# Altium integrated library Jack_LibraryLibPkg.IntLib: 77 symbols (continued)
## 100nF Cap (continued)
footprint 0402 Capacitor (Chip Capacitor, 2-Leads, Body 1.00x0.50mm, IPC Medium Density)
pins: 1, 2

## 220pF_Cap
designator C?  value 220pF  (hidden comment: 220pF_Cap)
50V 220pF X7R ±10% 0603 Multilayer Ceramic Capacitors MLCC - SMD/SMT ROHS; Manufacturer: Samsung Electro-Mechanics; Manufacturer Part Number: CL10B221KB8NNNC; Supplier: LCSC; Supplier Part Number: C1603; ComponentLink1URL: https://datasheet.octopart.com:443/CL10B221KB8NNNC-Samsung-Electro-Mechanics-datasheet-136482329.pdf?src-supplier=IHS; ComponentLink1Description: https://datasheet.octopart.com:443/CL10B221KB8NNNC-Samsung-Electro-Mechanics-datasheet-136482329.pdf?src-supplier=IHS; ComponentLink2URL: https://datasheet.octopart.com/CL10B221KB8NNNC-Samsung-Electro-Mechanics-datasheet-8324245.pdf; ComponentLink2Description: https://datasheet.octopart.com/CL10B221KB8NNNC-Samsung-Electro-Mechanics-datasheet-8324245.pdf; ComponentLink3URL: https://datasheet.octopart.com/CL10B221KB8NNNC-Samsung-Electro-Mechanics-datasheet-97040617.pdf; ComponentLink3Description: https://datasheet.octopart.com/CL10B221KB8NNNC-Samsung-Electro-Mechanics-datasheet-97040617.pdf; ComponentLink4URL: https://datasheet.octopart.com/General-Multilayer-Ceramic-Capacitors-Samsung-datasheet-family-111.pdf; ComponentLink4Description: https://datasheet.octopart.com/General-Multilayer-Ceramic-Capacitors-Samsung-datasheet-family-111.pdf; ComponentLink5URL: https://datasheet.octopart.com:443/CL10B221KB8NNNC-Samsung-Electro-Mechanics-datasheet-116120877.pdf?src-supplier=Future+Electronics; ComponentLink5Description: https://datasheet.octopart.com:443/CL10B221KB8NNNC-Samsung-Electro-Mechanics-datasheet-116120877.pdf?src-supplier=Future+Electronics; ComponentLink6URL: https://datasheet.octopart.com:443/CL10B221KB8NNNC-Samsung-Electro-Mechanics-datasheet-81461868.pdf?src-supplier=Future+Electronics; ComponentLink6Description: https://datasheet.octopart.com:443/CL10B221KB8NNNC-Samsung-Electro-Mechanics-datasheet-81461868.pdf?src-supplier=Future+Electronics; ComponentLink7URL: https://datasheet.octopart.com:443/CL10B221KB8NNNC-Samsung-datasheet-26669033.pdf?src-supplier=Future+Electronics; ComponentLink7Description: https://datasheet.octopart.com:443/CL10B221KB8NNNC-Samsung-datasheet-26669033.pdf?src-supplier=Future+Electronics; ComponentLink8URL: https://datasheet.octopart.com:443/CL10B221KB8NNNC-Samsung-Electro-Mechanics-datasheet-149136815.pdf?src-supplier=Future+Electronics; ComponentLink8Description: https://datasheet.octopart.com:443/CL10B221KB8NNNC-Samsung-Electro-Mechanics-datasheet-149136815.pdf?src-supplier=Future+Electronics; ComponentLink9URL: https://datasheet.octopart.com:443/CL10B221KB8NNNC-Samsung-datasheet-37081328.pdf?src-supplier=Future+Electronics; ComponentLink9Description: https://datasheet.octopart.com:443/CL10B221KB8NNNC-Samsung-datasheet-37081328.pdf?src-supplier=Future+Electronics; ComponentLink10URL: https://datasheet.octopart.com:443/CL10B221KB8NNNC-Samsung-datasheet-8326407.pdf?src-supplier=TME; ComponentLink10Description: https://datasheet.octopart.com:443/CL10B221KB8NNNC-Samsung-datasheet-8326407.pdf?src-supplier=TME; ComponentLink11URL: https://datasheet.octopart.com:443/CL10B221KB8NNNC-Samsung-Electro-Mechanics-datasheet-11541288.pdf?src-supplier=Arrow+Electronics; ComponentLink11Description: https://datasheet.octopart.com:443/CL10B221KB8NNNC-Samsung-Electro-Mechanics-datasheet-11541288.pdf?src-supplier=Arrow+Electronics; ComponentLink12URL: http://sigma.octopart.com:80/rohs_certificate/General-Multilayer-Ceramic-Capacitors-Samsung-family-110.pdf?src-supplier=Compliance+Statements; ComponentLink12Description: http://sigma.octopart.com:80/rohs_certificate/General-Multilayer-Ceramic-Capacitors-Samsung-family-110.pdf?src-supplier=Compliance+Statements; ComponentLink13URL: http://sigma.octopart.com:80/rohs_statement/General-Multilayer-Ceramic-Capacitors-Samsung-family-132.pdf?src-supplier=Compliance+Statements; ComponentLink13Description: http://sigma.octopart.com:80/rohs_statement/General-Multilayer-Ceramic-Capacitors-Samsung-family-132.pdf?src-supplier=Compliance+Statements; ComponentLink14URL: http://sigma.octopart.com:80/reach_statement/General-Multilayer-Ceramic-Capacitors-Samsung-family-133.pdf?src-supplier=Compliance+Statements; ComponentLink14Description: http://sigma.octopart.com:80/reach_statement/General-Multilayer-Ceramic-Capacitors-Samsung-family-133.pdf?src-supplier=Compliance+Statements
footprint 0603 Capacitor (Chip Capacitor, 2-Leads, Body 1.60x0.80mm, IPC Medium Density)
pins: 1, 2

## 499kRes
designator R?  value 499k  (hidden comment: 499kRes)
Resistor; Manufacturer: UNI-ROYAL(Uniroyal Elec); Manufacturer Part Number: 0603WAF4993T5E; Supplier: LCSC; Supplier Part Number: C26751
footprint 0603 Resistor (Chip Resistor, 2-Leads, Body 1.60x0.80mm, IPC Medium Density)
pins: 1, 2

## 2870_Res
designator R?  value 2870  (hidden comment: 2870_Res)
Resistor; Manufacturer: UNI-ROYAL(Uniroyal Elec); Manufacturer Part Number: 0603WAF2871T5E; Supplier: LCSC; Supplier Part Number: C22907
footprint 0603 Resistor (Chip Resistor, 2-Leads, Body 1.60x0.80mm, IPC Medium Density)
pins: 1, 2

## 12401826E412A
designator J?
USB Connector, 24 Contact(s), Female, Right Angle, Surface Mount Terminal, Locking, Receptacle; Manufacturer: Amphenol; Supplier: LCSC; Supplier Part Number: C3197788; Manufacturer Part Number: 12401826E412A; ComponentLink1URL: https://datasheet.octopart.com:443/12401826E412A-Amphenol-Communications-Solutions-datasheet-182242332.pdf?src-supplier=IHS; ComponentLink1Description: https://datasheet.octopart.com:443/12401826E412A-Amphenol-Communications-Solutions-datasheet-182242332.pdf?src-supplier=IHS; ComponentLink2URL: https://datasheet.octopart.com:443/12401826E412A-Amphenol-datasheet-112029729.pdf?src-supplier=Master+Electronics; ComponentLink2Description: https://datasheet.octopart.com:443/12401826E412A-Amphenol-datasheet-112029729.pdf?src-supplier=Master+Electronics
footprint 12401826E412A USBC
pins: A1 GND, A2 TX1+, A3 TX1-, A4 VBUS, A5 CC1, A6 D+, A7 D-, A8 SBU1, A9 VBUS, A10 RX2-, A11 RX2+, A12 GND, B1 GND, B2 TX2+, B3 TX2-, B4 VBUS, B5 CC2, B6 D+, B7 D-, B8 SBU2, B9 VBUS, B10 RX1-, B11 RX1+, B12 GND, SH1 SHEILD, SH2 SHEILD, SH3 SHEILD, SH4 SHEILD

## 527450897_CAN
designator J?
FFC / FPC Board Connector, 0.5 mm, 8 Contacts, Receptacle, Easy-On 52745 Series, Surface Mount; Manufacturer: Molex; Manufacturer Part Number: 52745-0897; Supplier: LCSC; Supplier Part Number: C277391; ComponentLink1URL: https://datasheet.octopart.com:443/52745-0897-Molex-datasheet-180776580.pdf?src-supplier=IHS; ComponentLink1Description: https://datasheet.octopart.com:443/52745-0897-Molex-datasheet-180776580.pdf?src-supplier=IHS; ComponentLink2URL: https://datasheet.octopart.com:443/52745-0897-Molex-datasheet-13777365.pdf?src-supplier=Sager+Electronics; ComponentLink2Description: https://datasheet.octopart.com:443/52745-0897-Molex-datasheet-13777365.pdf?src-supplier=Sager+Electronics; ComponentLink3URL: https://datasheet.octopart.com:443/0527450897-Molex-datasheet-155331244.pdf?src-supplier=Sager+Electronics; ComponentLink3Description: https://datasheet.octopart.com:443/0527450897-Molex-datasheet-155331244.pdf?src-supplier=Sager+Electronics; ComponentLink4URL: https://sigma.octopart.com:443/15649097/technical_drawing/Molex-52745-0897.pdf?src-supplier=Molex; ComponentLink4Description: https://sigma.octopart.com:443/15649097/technical_drawing/Molex-52745-0897.pdf?src-supplier=Molex; ComponentLink5URL: https://datasheet.octopart.com:443/527450897-Molex-datasheet-8335871.pdf?src-supplier=Molex; ComponentLink5Description: https://datasheet.octopart.com:443/527450897-Molex-datasheet-8335871.pdf?src-supplier=Molex; ComponentLink6URL: https://datasheet.octopart.com:443/52745-0897-Molex-datasheet-66420196.pdf?src-supplier=Farnell; ComponentLink6Description: https://datasheet.octopart.com:443/52745-0897-Molex-datasheet-66420196.pdf?src-supplier=Farnell; ComponentLink7URL: https://datasheet.octopart.com:443/52745-0897-Molex-datasheet-17587070.pdf?src-supplier=Farnell; ComponentLink7Description: https://datasheet.octopart.com:443/52745-0897-Molex-datasheet-17587070.pdf?src-supplier=Farnell; ComponentLink8URL: https://datasheet.octopart.com:443/52745-0897-Molex-datasheet-66628626.pdf?src-supplier=element14+APAC; ComponentLink8Description: https://datasheet.octopart.com:443/52745-0897-Molex-datasheet-66628626.pdf?src-supplier=element14+APAC; ComponentLink9URL: https://datasheet.octopart.com:443/52745-0897.-Molex-datasheet-68625854.pdf?src-supplier=element14+APAC; ComponentLink9Description: https://datasheet.octopart.com:443/52745-0897.-Molex-datasheet-68625854.pdf?src-supplier=element14+APAC; ComponentLink10URL: https://datasheet.octopart.com:443/52745-0897-Molex-datasheet-48881491.pdf?src-supplier=element14+APAC; ComponentLink10Description: https://datasheet.octopart.com:443/52745-0897-Molex-datasheet-48881491.pdf?src-supplier=element14+APAC; ComponentLink11URL: https://datasheet.octopart.com:443/52745-0897-Molex-datasheet-154755773.pdf?src-supplier=Master+Electronics; ComponentLink11Description: https://datasheet.octopart.com:443/52745-0897-Molex-datasheet-154755773.pdf?src-supplier=Master+Electronics; ComponentLink12URL: https://datasheet.octopart.com:443/52745-0897-Molex-datasheet-140186379.pdf?src-supplier=RS+(Formerly+Allied+Electronics); ComponentLink12Description: https://datasheet.octopart.com:443/52745-0897-Molex-datasheet-140186379.pdf?src-supplier=RS+(Formerly+Allied+Electronics); ComponentLink13URL: https://datasheet.octopart.com:443/52745-0897-Molex-datasheet-120153560.pdf?src-supplier=RS+(Formerly+Allied+Electronics); ComponentLink13Description: https://datasheet.octopart.com:443/52745-0897-Molex-datasheet-120153560.pdf?src-supplier=RS+(Formerly+Allied+Electronics); ComponentLink14URL: https://datasheet.octopart.com:443/52745-0897-Molex-datasheet-28806792.pdf?src-supplier=RS+(Formerly+Allied+Electronics); ComponentLink14Description: https://datasheet.octopart.com:443/52745-0897-Molex-datasheet-28806792.pdf?src-supplier=RS+(Formerly+Allied+Electronics); ComponentLink15URL: https://datasheet.octopart.com:443/52745-0897-Molex-datasheet-21218790.pdf?src-supplier=TME; ComponentLink15Description: https://datasheet.octopart.com:443/52745-0897-Molex-datasheet-21218790.pdf?src-supplier=TME; ComponentLink16URL: https://datasheet.octopart.com:443/0527450897-Molex-datasheet-11838050.pdf?src-supplier=Arrow+Electronics; ComponentLink16Description: https://datasheet.octopart.com:443/0527450897-Molex-datasheet-11838050.pdf?src-supplier=Arrow+Electronics; ComponentLink17URL: https://datasheet.octopart.com:443/0527450897-Molex-datasheet-11618016.pdf?src-supplier=Arrow+Electronics; ComponentLink17Description: https://datasheet.octopart.com:443/0527450897-Molex-datasheet-11618016.pdf?src-supplier=Arrow+Electronics; ComponentLink18URL: http://sigma.octopart.com:80/15649100/rohs_statement/Molex-52745-0897.pdf?src-supplier=Compliance+Statements; ComponentLink18Description: http://sigma.octopart.com:80/15649100/rohs_statement/Molex-52745-0897.pdf?src-supplier=Compliance+Statements; ComponentLink19URL: http://sigma.octopart.com:80/reach_statement/Molex-company-74.pdf?src-supplier=Compliance+Statements; ComponentLink19Description: http://sigma.octopart.com:80/reach_statement/Molex-company-74.pdf?src-supplier=Compliance+Statements; ComponentLink20URL: http://sigma.octopart.com:80/rohs_statement/Molex-company-73.pdf?src-supplier=Compliance+Statements; ComponentLink20Description: http://sigma.octopart.com:80/rohs_statement/Molex-company-73.pdf?src-supplier=Compliance+Statements; ComponentLink21URL: http://sigma.octopart.com:80/conflict_mineral_statement/Molex-company-72.pdf?src-supplier=Compliance+Statements; ComponentLink21Description: http://sigma.octopart.com:80/conflict_mineral_statement/Molex-company-72.pdf?src-supplier=Compliance+Statements
footprint 527450897 FPC
pins: 1 SDA, 2 SCL, 3 GND, 4 CANH, 5 CANL, 6 GND, 7 VIN, 8 VIN, P1 MP1, P2 MP2

## 527450897_LCD
designator J?
FFC / FPC Board Connector, 0.5 mm, 8 Contacts, Receptacle, Easy-On 52745 Series, Surface Mount; Manufacturer: Molex; Manufacturer Part Number: 52745-0897; Supplier: LCSC; Supplier Part Number: C277391; ComponentLink1URL: https://datasheet.octopart.com:443/52745-0897-Molex-datasheet-180776580.pdf?src-supplier=IHS; ComponentLink1Description: https://datasheet.octopart.com:443/52745-0897-Molex-datasheet-180776580.pdf?src-supplier=IHS; ComponentLink2URL: https://datasheet.octopart.com:443/52745-0897-Molex-datasheet-13777365.pdf?src-supplier=Sager+Electronics; ComponentLink2Description: https://datasheet.octopart.com:443/52745-0897-Molex-datasheet-13777365.pdf?src-supplier=Sager+Electronics; ComponentLink3URL: https://datasheet.octopart.com:443/0527450897-Molex-datasheet-155331244.pdf?src-supplier=Sager+Electronics; ComponentLink3Description: https://datasheet.octopart.com:443/0527450897-Molex-datasheet-155331244.pdf?src-supplier=Sager+Electronics; ComponentLink4URL: https://sigma.octopart.com:443/15649097/technical_drawing/Molex-52745-0897.pdf?src-supplier=Molex; ComponentLink4Description: https://sigma.octopart.com:443/15649097/technical_drawing/Molex-52745-0897.pdf?src-supplier=Molex; ComponentLink5URL: https://datasheet.octopart.com:443/527450897-Molex-datasheet-8335871.pdf?src-supplier=Molex; ComponentLink5Description: https://datasheet.octopart.com:443/527450897-Molex-datasheet-8335871.pdf?src-supplier=Molex; ComponentLink6URL: https://datasheet.octopart.com:443/52745-0897-Molex-datasheet-66420196.pdf?src-supplier=Farnell; ComponentLink6Description: https://datasheet.octopart.com:443/52745-0897-Molex-datasheet-66420196.pdf?src-supplier=Farnell; ComponentLink7URL: https://datasheet.octopart.com:443/52745-0897-Molex-datasheet-17587070.pdf?src-supplier=Farnell; ComponentLink7Description: https://datasheet.octopart.com:443/52745-0897-Molex-datasheet-17587070.pdf?src-supplier=Farnell; ComponentLink8URL: https://datasheet.octopart.com:443/52745-0897-Molex-datasheet-66628626.pdf?src-supplier=element14+APAC; ComponentLink8Description: https://datasheet.octopart.com:443/52745-0897-Molex-datasheet-66628626.pdf?src-supplier=element14+APAC; ComponentLink9URL: https://datasheet.octopart.com:443/52745-0897.-Molex-datasheet-68625854.pdf?src-supplier=element14+APAC; ComponentLink9Description: https://datasheet.octopart.com:443/52745-0897.-Molex-datasheet-68625854.pdf?src-supplier=element14+APAC; ComponentLink10URL: https://datasheet.octopart.com:443/52745-0897-Molex-datasheet-48881491.pdf?src-supplier=element14+APAC; ComponentLink10Description: https://datasheet.octopart.com:443/52745-0897-Molex-datasheet-48881491.pdf?src-supplier=element14+APAC; ComponentLink11URL: https://datasheet.octopart.com:443/52745-0897-Molex-datasheet-154755773.pdf?src-supplier=Master+Electronics; ComponentLink11Description: https://datasheet.octopart.com:443/52745-0897-Molex-datasheet-154755773.pdf?src-supplier=Master+Electronics; ComponentLink12URL: https://datasheet.octopart.com:443/52745-0897-Molex-datasheet-140186379.pdf?src-supplier=RS+(Formerly+Allied+Electronics); ComponentLink12Description: https://datasheet.octopart.com:443/52745-0897-Molex-datasheet-140186379.pdf?src-supplier=RS+(Formerly+Allied+Electronics); ComponentLink13URL: https://datasheet.octopart.com:443/52745-0897-Molex-datasheet-120153560.pdf?src-supplier=RS+(Formerly+Allied+Electronics); ComponentLink13Description: https://datasheet.octopart.com:443/52745-0897-Molex-datasheet-120153560.pdf?src-supplier=RS+(Formerly+Allied+Electronics); ComponentLink14URL: https://datasheet.octopart.com:443/52745-0897-Molex-datasheet-28806792.pdf?src-supplier=RS+(Formerly+Allied+Electronics); ComponentLink14Description: https://datasheet.octopart.com:443/52745-0897-Molex-datasheet-28806792.pdf?src-supplier=RS+(Formerly+Allied+Electronics); ComponentLink15URL: https://datasheet.octopart.com:443/52745-0897-Molex-datasheet-21218790.pdf?src-supplier=TME; ComponentLink15Description: https://datasheet.octopart.com:443/52745-0897-Molex-datasheet-21218790.pdf?src-supplier=TME; ComponentLink16URL: https://datasheet.octopart.com:443/0527450897-Molex-datasheet-11838050.pdf?src-supplier=Arrow+Electronics; ComponentLink16Description: https://datasheet.octopart.com:443/0527450897-Molex-datasheet-11838050.pdf?src-supplier=Arrow+Electronics; ComponentLink17URL: https://datasheet.octopart.com:443/0527450897-Molex-datasheet-11618016.pdf?src-supplier=Arrow+Electronics; ComponentLink17Description: https://datasheet.octopart.com:443/0527450897-Molex-datasheet-11618016.pdf?src-supplier=Arrow+Electronics; ComponentLink18URL: http://sigma.octopart.com:80/15649100/rohs_statement/Molex-52745-0897.pdf?src-supplier=Compliance+Statements; ComponentLink18Description: http://sigma.octopart.com:80/15649100/rohs_statement/Molex-52745-0897.pdf?src-supplier=Compliance+Statements; ComponentLink19URL: http://sigma.octopart.com:80/reach_statement/Molex-company-74.pdf?src-supplier=Compliance+Statements; ComponentLink19Description: http://sigma.octopart.com:80/reach_statement/Molex-company-74.pdf?src-supplier=Compliance+Statements; ComponentLink20URL: http://sigma.octopart.com:80/rohs_statement/Molex-company-73.pdf?src-supplier=Compliance+Statements; ComponentLink20Description: http://sigma.octopart.com:80/rohs_statement/Molex-company-73.pdf?src-supplier=Compliance+Statements; ComponentLink21URL: http://sigma.octopart.com:80/conflict_mineral_statement/Molex-company-72.pdf?src-supplier=Compliance+Statements; ComponentLink21Description: http://sigma.octopart.com:80/conflict_mineral_statement/Molex-company-72.pdf?src-supplier=Compliance+Statements
footprint 527450897 FPC
pins: 1 GND, 2 NC, 3 VDD, 4 SCL, 5 SDA, 6 INT, 7 RESET, 8 GND, P1 MP1, P2 MP2

## 527452097
designator J?
FFC / FPC Connectors FFC, FPC Contacts, Top Surface Mount, Right Angle T/R; Manufacturer: Molex; Manufacturer Part Number: 52745-2097; Supplier: LCSC; Supplier Part Number: C164167; ComponentLink1URL: https://datasheet.octopart.com:443/52745-2097-Molex-datasheet-180776580.pdf?src-supplier=IHS; ComponentLink1Description: https://datasheet.octopart.com:443/52745-2097-Molex-datasheet-180776580.pdf?src-supplier=IHS; ComponentLink2URL: https://datasheet.octopart.com:443/52745-2097-Molex-datasheet-13775033.pdf?src-supplier=Molex; ComponentLink2Description: https://datasheet.octopart.com:443/52745-2097-Molex-datasheet-13775033.pdf?src-supplier=Molex; ComponentLink3URL: https://sigma.octopart.com:443/15649097/technical_drawing/Molex-52745-2097.pdf?src-supplier=Molex; ComponentLink3Description: https://sigma.octopart.com:443/15649097/technical_drawing/Molex-52745-2097.pdf?src-supplier=Molex; ComponentLink4URL: https://datasheet.octopart.com:443/527452097-Molex-datasheet-8335871.pdf?src-supplier=Factory+Futures; ComponentLink4Description: https://datasheet.octopart.com:443/527452097-Molex-datasheet-8335871.pdf?src-supplier=Factory+Futures; ComponentLink5URL: https://datasheet.octopart.com:443/52745-2097-Molex-datasheet-11535467.pdf?src-supplier=Arrow+Electronics; ComponentLink5Description: https://datasheet.octopart.com:443/52745-2097-Molex-datasheet-11535467.pdf?src-supplier=Arrow+Electronics; ComponentLink6URL: https://datasheet.octopart.com:443/0527452097-Molex-datasheet-11973683.pdf?src-supplier=Arrow+Electronics; ComponentLink6Description: https://datasheet.octopart.com:443/0527452097-Molex-datasheet-11973683.pdf?src-supplier=Arrow+Electronics; ComponentLink7URL: https://datasheet.octopart.com:443/52745-2097-Molex-datasheet-154755790.pdf?src-supplier=Master+Electronics; ComponentLink7Description: https://datasheet.octopart.com:443/52745-2097-Molex-datasheet-154755790.pdf?src-supplier=Master+Electronics; ComponentLink8URL: https://datasheet.octopart.com:443/52745-2097-Molex-datasheet-66628635.pdf?src-supplier=element14+APAC; ComponentLink8Description: https://datasheet.octopart.com:443/52745-2097-Molex-datasheet-66628635.pdf?src-supplier=element14+APAC; ComponentLink9URL: https://datasheet.octopart.com:443/52745-2097-Molex-datasheet-140186386.pdf?src-supplier=RS+(Formerly+Allied+Electronics); ComponentLink9Description: https://datasheet.octopart.com:443/52745-2097-Molex-datasheet-140186386.pdf?src-supplier=RS+(Formerly+Allied+Electronics); ComponentLink10URL: https://datasheet.octopart.com:443/52745-2097-Molex-datasheet-120153567.pdf?src-supplier=RS+(Formerly+Allied+Electronics); ComponentLink10Description: https://datasheet.octopart.com:443/52745-2097-Molex-datasheet-120153567.pdf?src-supplier=RS+(Formerly+Allied+Electronics); ComponentLink11URL: https://datasheet.octopart.com:443/52745-2097-Molex-datasheet-62059355.pdf?src-supplier=RS+(Formerly+Allied+Electronics); ComponentLink11Description: https://datasheet.octopart.com:443/52745-2097-Molex-datasheet-62059355.pdf?src-supplier=RS+(Formerly+Allied+Electronics); ComponentLink12URL: https://datasheet.octopart.com:443/52745-2097-Molex-datasheet-77521212.pdf?src-supplier=Newark; ComponentLink12Description: https://datasheet.octopart.com:443/52745-2097-Molex-datasheet-77521212.pdf?src-supplier=Newark; ComponentLink13URL: https://datasheet.octopart.com:443/52745-2097-Molex-datasheet-62116793.pdf?src-supplier=Electro+Sonic; ComponentLink13Description: https://datasheet.octopart.com:443/52745-2097-Molex-datasheet-62116793.pdf?src-supplier=Electro+Sonic; ComponentLink14URL: https://datasheet.octopart.com:443/52745-2097-Molex-datasheet-28806792.pdf?src-supplier=TME; ComponentLink14Description: https://datasheet.octopart.com:443/52745-2097-Molex-datasheet-28806792.pdf?src-supplier=TME; ComponentLink15URL: https://datasheet.octopart.com:443/52745-2097-Molex-datasheet-10979466.pdf?src-supplier=Farnell; ComponentLink15Description: https://datasheet.octopart.com:443/52745-2097-Molex-datasheet-10979466.pdf?src-supplier=Farnell; ComponentLink16URL: https://datasheet.octopart.com:443/52745-2097-Molex-datasheet-8878058.pdf?src-supplier=Farnell; ComponentLink16Description: https://datasheet.octopart.com:443/52745-2097-Molex-datasheet-8878058.pdf?src-supplier=Farnell; ComponentLink17URL: http://sigma.octopart.com:80/15649113/rohs_statement/Molex-52745-2097.pdf?src-supplier=Compliance+Statements; ComponentLink17Description: http://sigma.octopart.com:80/15649113/rohs_statement/Molex-52745-2097.pdf?src-supplier=Compliance+Statements; ComponentLink18URL: http://sigma.octopart.com:80/reach_statement/Molex-company-74.pdf?src-supplier=Compliance+Statements; ComponentLink18Description: http://sigma.octopart.com:80/reach_statement/Molex-company-74.pdf?src-supplier=Compliance+Statements; ComponentLink19URL: http://sigma.octopart.com:80/rohs_statement/Molex-company-73.pdf?src-supplier=Compliance+Statements; ComponentLink19Description: http://sigma.octopart.com:80/rohs_statement/Molex-company-73.pdf?src-supplier=Compliance+Statements; ComponentLink20URL: http://sigma.octopart.com:80/conflict_mineral_statement/Molex-company-72.pdf?src-supplier=Compliance+Statements; ComponentLink20Description: http://sigma.octopart.com:80/conflict_mineral_statement/Molex-company-72.pdf?src-supplier=Compliance+Statements
footprint 527452097 20 pin FPC
pins: 1 NC, 2 LEDK, 3 NC, 4 LEDA, 5 NC, 6 VCI, 7 VCC_IO, 8 TE, 9 RESET, 10 GND, 11 MIPI_D1P, 12 MIPI_D1N, 13 GND, 14 MIPI_CLP, 15 MIPI_CLN, 16 GND, 17 MIPI_D0P, 18 MIPI_D0N, 19 GND, 20 GND, P1 MP1, P2 MP2

## 527452097_LED
designator J?
FFC / FPC Connectors FFC, FPC Contacts, Top Surface Mount, Right Angle T/R / Pinout for LED control.; Manufacturer: Molex; Manufacturer Part Number: 52745-2097; Supplier: LCSC; Supplier Part Number: C164167; ComponentLink1URL: https://datasheet.octopart.com:443/52745-2097-Molex-datasheet-180776580.pdf?src-supplier=IHS; ComponentLink1Description: https://datasheet.octopart.com:443/52745-2097-Molex-datasheet-180776580.pdf?src-supplier=IHS; ComponentLink2URL: https://datasheet.octopart.com:443/52745-2097-Molex-datasheet-13775033.pdf?src-supplier=Molex; ComponentLink2Description: https://datasheet.octopart.com:443/52745-2097-Molex-datasheet-13775033.pdf?src-supplier=Molex; ComponentLink3URL: https://sigma.octopart.com:443/15649097/technical_drawing/Molex-52745-2097.pdf?src-supplier=Molex; ComponentLink3Description: https://sigma.octopart.com:443/15649097/technical_drawing/Molex-52745-2097.pdf?src-supplier=Molex; ComponentLink4URL: https://datasheet.octopart.com:443/527452097-Molex-datasheet-8335871.pdf?src-supplier=Factory+Futures; ComponentLink4Description: https://datasheet.octopart.com:443/527452097-Molex-datasheet-8335871.pdf?src-supplier=Factory+Futures; ComponentLink5URL: https://datasheet.octopart.com:443/52745-2097-Molex-datasheet-11535467.pdf?src-supplier=Arrow+Electronics; ComponentLink5Description: https://datasheet.octopart.com:443/52745-2097-Molex-datasheet-11535467.pdf?src-supplier=Arrow+Electronics; ComponentLink6URL: https://datasheet.octopart.com:443/0527452097-Molex-datasheet-11973683.pdf?src-supplier=Arrow+Electronics; ComponentLink6Description: https://datasheet.octopart.com:443/0527452097-Molex-datasheet-11973683.pdf?src-supplier=Arrow+Electronics; ComponentLink7URL: https://datasheet.octopart.com:443/52745-2097-Molex-datasheet-154755790.pdf?src-supplier=Master+Electronics; ComponentLink7Description: https://datasheet.octopart.com:443/52745-2097-Molex-datasheet-154755790.pdf?src-supplier=Master+Electronics; ComponentLink8URL: https://datasheet.octopart.com:443/52745-2097-Molex-datasheet-66628635.pdf?src-supplier=element14+APAC; ComponentLink8Description: https://datasheet.octopart.com:443/52745-2097-Molex-datasheet-66628635.pdf?src-supplier=element14+APAC; ComponentLink9URL: https://datasheet.octopart.com:443/52745-2097-Molex-datasheet-140186386.pdf?src-supplier=RS+(Formerly+Allied+Electronics); ComponentLink9Description: https://datasheet.octopart.com:443/52745-2097-Molex-datasheet-140186386.pdf?src-supplier=RS+(Formerly+Allied+Electronics); ComponentLink10URL: https://datasheet.octopart.com:443/52745-2097-Molex-datasheet-120153567.pdf?src-supplier=RS+(Formerly+Allied+Electronics); ComponentLink10Description: https://datasheet.octopart.com:443/52745-2097-Molex-datasheet-120153567.pdf?src-supplier=RS+(Formerly+Allied+Electronics); ComponentLink11URL: https://datasheet.octopart.com:443/52745-2097-Molex-datasheet-62059355.pdf?src-supplier=RS+(Formerly+Allied+Electronics); ComponentLink11Description: https://datasheet.octopart.com:443/52745-2097-Molex-datasheet-62059355.pdf?src-supplier=RS+(Formerly+Allied+Electronics); ComponentLink12URL: https://datasheet.octopart.com:443/52745-2097-Molex-datasheet-77521212.pdf?src-supplier=Newark; ComponentLink12Description: https://datasheet.octopart.com:443/52745-2097-Molex-datasheet-77521212.pdf?src-supplier=Newark; ComponentLink13URL: https://datasheet.octopart.com:443/52745-2097-Molex-datasheet-62116793.pdf?src-supplier=Electro+Sonic; ComponentLink13Description: https://datasheet.octopart.com:443/52745-2097-Molex-datasheet-62116793.pdf?src-supplier=Electro+Sonic; ComponentLink14URL: https://datasheet.octopart.com:443/52745-2097-Molex-datasheet-28806792.pdf?src-supplier=TME; ComponentLink14Description: https://datasheet.octopart.com:443/52745-2097-Molex-datasheet-28806792.pdf?src-supplier=TME; ComponentLink15URL: https://datasheet.octopart.com:443/52745-2097-Molex-datasheet-10979466.pdf?src-supplier=Farnell; ComponentLink15Description: https://datasheet.octopart.com:443/52745-2097-Molex-datasheet-10979466.pdf?src-supplier=Farnell; ComponentLink16URL: https://datasheet.octopart.com:443/52745-2097-Molex-datasheet-8878058.pdf?src-supplier=Farnell; ComponentLink16Description: https://datasheet.octopart.com:443/52745-2097-Molex-datasheet-8878058.pdf?src-supplier=Farnell; ComponentLink17URL: http://sigma.octopart.com:80/15649113/rohs_statement/Molex-52745-2097.pdf?src-supplier=Compliance+Statements; ComponentLink17Description: http://sigma.octopart.com:80/15649113/rohs_statement/Molex-52745-2097.pdf?src-supplier=Compliance+Statements; ComponentLink18URL: http://sigma.octopart.com:80/reach_statement/Molex-company-74.pdf?src-supplier=Compliance+Statements; ComponentLink18Description: http://sigma.octopart.com:80/reach_statement/Molex-company-74.pdf?src-supplier=Compliance+Statements; ComponentLink19URL: http://sigma.octopart.com:80/rohs_statement/Molex-company-73.pdf?src-supplier=Compliance+Statements; ComponentLink19Description: http://sigma.octopart.com:80/rohs_statement/Molex-company-73.pdf?src-supplier=Compliance+Statements; ComponentLink20URL: http://sigma.octopart.com:80/conflict_mineral_statement/Molex-company-72.pdf?src-supplier=Compliance+Statements; ComponentLink20Description: http://sigma.octopart.com:80/conflict_mineral_statement/Molex-company-72.pdf?src-supplier=Compliance+Statements
footprint 527452097 20 pin FPC
pins: 1 LED1A, 2 LED8K, 3 LED2A, 4 LED7K, 5 LED3A, 6 LED6K, 7 LED4A, 8 LED5K, 9 LED5A, 10 LED4K, 11 LED6A, 12 LED3K, 13 LED7A, 14 LED2K, 15 LED8A, 16 LED1K, 17 GND, 18 SCL, 19 SDA, 20 VCC, P1 MP1, P2 MP2

## 527452097_LED_B_Side
designator J?, comment 527452097_LED
FFC / FPC Connectors FFC, FPC Contacts, Top Surface Mount, Right Angle T/R / Pinout for LED control.; Manufacturer: Molex; Manufacturer Part Number: 52745-2097; Supplier: LCSC; Supplier Part Number: C164167; ComponentLink1URL: https://datasheet.octopart.com:443/52745-2097-Molex-datasheet-180776580.pdf?src-supplier=IHS; ComponentLink1Description: https://datasheet.octopart.com:443/52745-2097-Molex-datasheet-180776580.pdf?src-supplier=IHS; ComponentLink2URL: https://datasheet.octopart.com:443/52745-2097-Molex-datasheet-13775033.pdf?src-supplier=Molex; ComponentLink2Description: https://datasheet.octopart.com:443/52745-2097-Molex-datasheet-13775033.pdf?src-supplier=Molex; ComponentLink3URL: https://sigma.octopart.com:443/15649097/technical_drawing/Molex-52745-2097.pdf?src-supplier=Molex; ComponentLink3Description: https://sigma.octopart.com:443/15649097/technical_drawing/Molex-52745-2097.pdf?src-supplier=Molex; ComponentLink4URL: https://datasheet.octopart.com:443/527452097-Molex-datasheet-8335871.pdf?src-supplier=Factory+Futures; ComponentLink4Description: https://datasheet.octopart.com:443/527452097-Molex-datasheet-8335871.pdf?src-supplier=Factory+Futures; ComponentLink5URL: https://datasheet.octopart.com:443/52745-2097-Molex-datasheet-11535467.pdf?src-supplier=Arrow+Electronics; ComponentLink5Description: https://datasheet.octopart.com:443/52745-2097-Molex-datasheet-11535467.pdf?src-supplier=Arrow+Electronics; ComponentLink6URL: https://datasheet.octopart.com:443/0527452097-Molex-datasheet-11973683.pdf?src-supplier=Arrow+Electronics; ComponentLink6Description: https://datasheet.octopart.com:443/0527452097-Molex-datasheet-11973683.pdf?src-supplier=Arrow+Electronics; ComponentLink7URL: https://datasheet.octopart.com:443/52745-2097-Molex-datasheet-154755790.pdf?src-supplier=Master+Electronics; ComponentLink7Description: https://datasheet.octopart.com:443/52745-2097-Molex-datasheet-154755790.pdf?src-supplier=Master+Electronics; ComponentLink8URL: https://datasheet.octopart.com:443/52745-2097-Molex-datasheet-66628635.pdf?src-supplier=element14+APAC; ComponentLink8Description: https://datasheet.octopart.com:443/52745-2097-Molex-datasheet-66628635.pdf?src-supplier=element14+APAC; ComponentLink9URL: https://datasheet.octopart.com:443/52745-2097-Molex-datasheet-140186386.pdf?src-supplier=RS+(Formerly+Allied+Electronics); ComponentLink9Description: https://datasheet.octopart.com:443/52745-2097-Molex-datasheet-140186386.pdf?src-supplier=RS+(Formerly+Allied+Electronics); ComponentLink10URL: https://datasheet.octopart.com:443/52745-2097-Molex-datasheet-120153567.pdf?src-supplier=RS+(Formerly+Allied+Electronics); ComponentLink10Description: https://datasheet.octopart.com:443/52745-2097-Molex-datasheet-120153567.pdf?src-supplier=RS+(Formerly+Allied+Electronics); ComponentLink11URL: https://datasheet.octopart.com:443/52745-2097-Molex-datasheet-62059355.pdf?src-supplier=RS+(Formerly+Allied+Electronics); ComponentLink11Description: https://datasheet.octopart.com:443/52745-2097-Molex-datasheet-62059355.pdf?src-supplier=RS+(Formerly+Allied+Electronics); ComponentLink12URL: https://datasheet.octopart.com:443/52745-2097-Molex-datasheet-77521212.pdf?src-supplier=Newark; ComponentLink12Description: https://datasheet.octopart.com:443/52745-2097-Molex-datasheet-77521212.pdf?src-supplier=Newark; ComponentLink13URL: https://datasheet.octopart.com:443/52745-2097-Molex-datasheet-62116793.pdf?src-supplier=Electro+Sonic; ComponentLink13Description: https://datasheet.octopart.com:443/52745-2097-Molex-datasheet-62116793.pdf?src-supplier=Electro+Sonic; ComponentLink14URL: https://datasheet.octopart.com:443/52745-2097-Molex-datasheet-28806792.pdf?src-supplier=TME; ComponentLink14Description: https://datasheet.octopart.com:443/52745-2097-Molex-datasheet-28806792.pdf?src-supplier=TME; ComponentLink15URL: https://datasheet.octopart.com:443/52745-2097-Molex-datasheet-10979466.pdf?src-supplier=Farnell; ComponentLink15Description: https://datasheet.octopart.com:443/52745-2097-Molex-datasheet-10979466.pdf?src-supplier=Farnell; ComponentLink16URL: https://datasheet.octopart.com:443/52745-2097-Molex-datasheet-8878058.pdf?src-supplier=Farnell; ComponentLink16Description: https://datasheet.octopart.com:443/52745-2097-Molex-datasheet-8878058.pdf?src-supplier=Farnell; ComponentLink17URL: http://sigma.octopart.com:80/15649113/rohs_statement/Molex-52745-2097.pdf?src-supplier=Compliance+Statements; ComponentLink17Description: http://sigma.octopart.com:80/15649113/rohs_statement/Molex-52745-2097.pdf?src-supplier=Compliance+Statements; ComponentLink18URL: http://sigma.octopart.com:80/reach_statement/Molex-company-74.pdf?src-supplier=Compliance+Statements; ComponentLink18Description: http://sigma.octopart.com:80/reach_statement/Molex-company-74.pdf?src-supplier=Compliance+Statements; ComponentLink19URL: http://sigma.octopart.com:80/rohs_statement/Molex-company-73.pdf?src-supplier=Compliance+Statements; ComponentLink19Description: http://sigma.octopart.com:80/rohs_statement/Molex-company-73.pdf?src-supplier=Compliance+Statements; ComponentLink20URL: http://sigma.octopart.com:80/conflict_mineral_statement/Molex-company-72.pdf?src-supplier=Compliance+Statements; ComponentLink20Description: http://sigma.octopart.com:80/conflict_mineral_statement/Molex-company-72.pdf?src-supplier=Compliance+Statements
footprint 527452097 20 pin FPC
pins: 1 VCC, 2 SDA, 3 SCL, 4 GND, 5 LED8K, 6 LED8A, 7 LED7K, 8 LED7A, 9 LED6K, 10 LED6A, 11 LED5K, 12 LED5A, 13 LED4K, 14 LED4A, 15 LED3K, 16 LED3A, 17 LED2K, 18 LED2A, 19 LED1K, 20 LED1A, P1 MP1, P2 MP2

## AD5672RBRUZ
designator U?
-40℃~+125℃ 1.8mA 12 1LSB 2.7V~5.5V 2ppm/℃ 5us 8 Built-in Built-in SPI Voltage Buffer TSSOP-20 Digital to Analog Converters (DAC) ROHS; Manufacturer: Analog Devices; Supplier: LCSC; Supplier Part Number: C650034; Manufacturer Part Number: AD5672RBRUZ
footprint TSOP20 (AD5672RBRUZ) (TSOP, 20-Leads, Body 6.50x4.40mm, Pitch 0.65mm, IPC Medium Density)
pins: 1 VOUT1, 2 VOUT0, 3 VDD, 4 VLOGIC, 5 ~{SYNC}, 6 SCLK, 7 SDI, 8 GAIN, 9 VOUT7, 10 VOUT6, 11 VOUT5, 12 VOUT4, 13 GND, 14 RSTSEL, 15 ~{LDAC}, 16 SDO, 17 ~{RESET}, 18 VREFOUT, 19 VOUT3, 20 VOUT2

## BAT-HLD-002-SMT
designator J?, comment Battery header
BATTERY RETAINER COIN 20MM SMD; Manufacturer: TE Connectivity Linx; Manufacturer Part Number: BAT-HLD-002-SMT; Supplier: DigiKey; Supplier Part Number: BAT-HLD-002-SMT-ND
footprint BAT-HLD-002-SMT Battery Holder
pins: N, P1 P, P2 P

## BLM18KG300TN1D
designator FB?
Ferrite Beads Multi-Layer Chip Bead 30Ohm 25% 100MHz 5A 0603 Paper T/R; Manufacturer: Murata; Supplier: LCSC; Supplier Part Number: C88982; Manufacturer Part Number: BLM18KG300TN1D; ComponentLink1URL: https://datasheet.octopart.com:443/BLM18KG300TN1D-Murata-datasheet-180806579.pdf?src-supplier=IHS; ComponentLink1Description: https://datasheet.octopart.com:443/BLM18KG300TN1D-Murata-datasheet-180806579.pdf?src-supplier=IHS; ComponentLink2URL: https://datasheet.octopart.com:443/BLM18KG300TN1D-Murata-datasheet-32036517.pdf?src-supplier=Newark; ComponentLink2Description: https://datasheet.octopart.com:443/BLM18KG300TN1D-Murata-datasheet-32036517.pdf?src-supplier=Newark; ComponentLink3URL: https://datasheet.octopart.com:443/BLM18KG300TN1D-Murata-datasheet-141257998.pdf?src-supplier=Ciiva; ComponentLink3Description: https://datasheet.octopart.com:443/BLM18KG300TN1D-Murata-datasheet-141257998.pdf?src-supplier=Ciiva; ComponentLink4URL: https://datasheet.octopart.com:443/BLM18KG300TN1D-Murata-datasheet-138707124.pdf?src-supplier=Ciiva; ComponentLink4Description: https://datasheet.octopart.com:443/BLM18KG300TN1D-Murata-datasheet-138707124.pdf?src-supplier=Ciiva; ComponentLink5URL: https://datasheet.octopart.com:443/BLM18KG300TN1D-Murata-datasheet-151955973.pdf?src-supplier=SOS+electronic; ComponentLink5Description: https://datasheet.octopart.com:443/BLM18KG300TN1D-Murata-datasheet-151955973.pdf?src-supplier=SOS+electronic; ComponentLink6URL: https://datasheet.octopart.com:443/BLM18KG300TN1D-Murata-datasheet-113093508.pdf?src-supplier=Future+Electronics; ComponentLink6Description: https://datasheet.octopart.com:443/BLM18KG300TN1D-Murata-datasheet-113093508.pdf?src-supplier=Future+Electronics; ComponentLink7URL: https://datasheet.octopart.com:443/BLM18KG300TN1D-Murata-datasheet-64290213.pdf?src-supplier=Future+Electronics; ComponentLink7Description: https://datasheet.octopart.com:443/BLM18KG300TN1D-Murata-datasheet-64290213.pdf?src-supplier=Future+Electronics; ComponentLink8URL: https://datasheet.octopart.com/BLM18KG300TN1D-Murata-datasheet-37129980.pdf; ComponentLink8Description: https://datasheet.octopart.com/BLM18KG300TN1D-Murata-datasheet-37129980.pdf; ComponentLink9URL: https://datasheet.octopart.com:443/BLM18KG300TN1D-Murata-datasheet-11550489.pdf?src-supplier=Arrow+Electronics; ComponentLink9Description: https://datasheet.octopart.com:443/BLM18KG300TN1D-Murata-datasheet-11550489.pdf?src-supplier=Arrow+Electronics; ComponentLink10URL: http://sigma.octopart.com:80/reach_statement/Murata-company-16.pdf?src-supplier=Compliance+Statements; ComponentLink10Description: http://sigma.octopart.com:80/reach_statement/Murata-company-16.pdf?src-supplier=Compliance+Statements
footprint 0603 Ferrite Bead (Chip Ferrite Bead, 2-Leads, Body 1.60x0.80mm, IPC Medium Density)
pins: 1, 2
